# Altium footprint library LDCN Components.PcbLib: 426 footprints (part 25 of 27)
Each footprint in its own frame and in the unit in brackets; x right, y up, seen from the top. Pads: shape width x height; smd on the part's side, far side on the other; paste and mask are expansions set on the pad; w line width, h text height; cw(c..) or ccw(c..) is an arc to the next point about the centre after c.
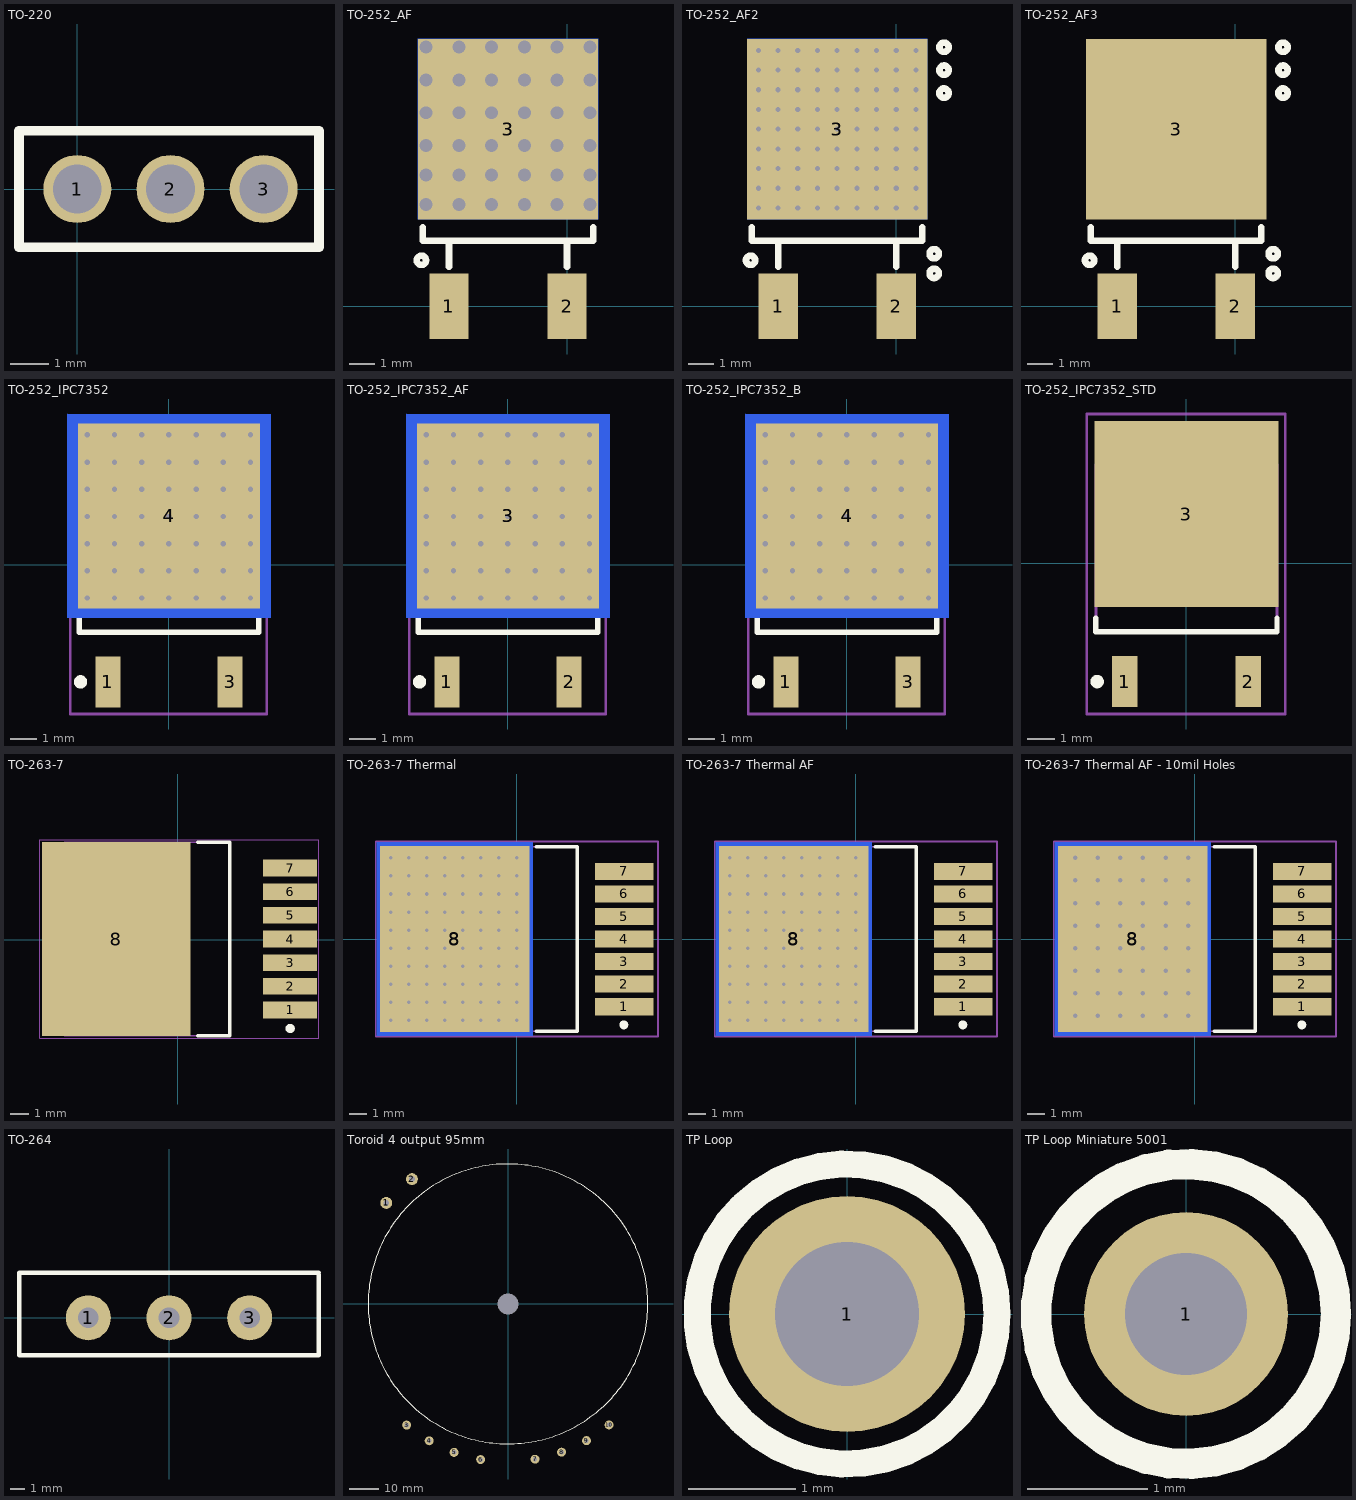
[diagram p24: the footprints below, top view; thin cyan lines are the x and y axes]

## TO-220 [mm] "Positive Voltage Regulator"
pads (3):
  round 1.75 hole 1.25: 1(0,0) 2(2.4,0) 3(4.8,0)
Top Overlay:
  lines w0.254: -1.5,-1.5 -1.5,1.5 6.223,1.5 6.223,-1.5 -1.5,-1.5

## TO-252_AF [mm] "Fairchild DPAK"
height 4
pads (40):
  rect 1.524x2.54 smd: 1(-4.572,0) 2(0,0)
  rect 6.985x6.985 smd: 3(-2.286,6.858)
  rect 6.985x6.985 smd far side: 3(-2.286,6.858)
  round 0.3 hole 0.5: ""(-5.461,3.937) ""(-5.461,5.08) ""(-5.461,6.223) ""(-5.461,7.493) ""(-5.461,8.763) ""(-5.461,10.033) ""(-4.191,3.937) ""(-4.191,5.08) ""(-4.191,6.223) ""(-4.191,7.493) ""(-4.191,8.763) ""(-4.191,10.033) ""(-2.921,3.937) ""(-2.921,5.08) ""(-2.921,6.223) ""(-2.921,7.493) ""(-2.921,8.763) ""(-2.921,10.033) ""(-1.651,3.937) ""(-1.651,5.08) ""(-1.651,6.223) ""(-1.651,7.493) ""(-1.651,8.763) ""(-1.651,10.033) ""(-0.381,3.937) ""(-0.381,5.08) ""(-0.381,6.223) ""(-0.381,7.493) ""(-0.381,8.763) ""(-0.381,10.033) ""(0.889,3.937) ""(0.889,5.08) ""(0.889,6.223) ""(0.889,7.493) ""(0.889,8.763) ""(0.889,10.033)
Top Overlay:
  circle w0.254: c-5.641,1.778 r0.18
  lines w0.254: -5.588,3.048 -5.588,2.54 1.016,2.54 1.016,3.048 ; -4.572,1.524 -4.572,2.54 ; 0,1.524 0,2.54

## TO-252_AF2 [mil] "Fairchild DPAK"
height 157.48
pads (85):
  rect 60x100 smd: 1(-180,0) 2(0,0)
  round 5 hole 7.87: 3(-210,150) 3(-210,180) 3(-210,210) 3(-210,240) 3(-210,270) 3(-210,300) 3(-210,330) 3(-210,360) 3(-210,390) 3(-180,150) 3(-180,180) 3(-180,210) 3(-180,240) 3(-180,270) 3(-180,300) 3(-180,330) 3(-180,360) 3(-180,390) 3(-150,150) 3(-150,180) 3(-150,210) 3(-150,240) 3(-150,270) 3(-150,300) 3(-150,330) 3(-150,360) 3(-150,390) 3(-120,150) 3(-120,180) 3(-120,210) 3(-120,240) 3(-120,270) 3(-120,300) 3(-120,330) 3(-120,360) 3(-120,390) 3(-90,150) 3(-90,180) 3(-90,210) 3(-90,240) 3(-90,270) 3(-90,300) 3(-90,330) 3(-90,360) 3(-90,390) 3(-60,150) 3(-60,180) 3(-60,210) 3(-60,240) 3(-60,270) 3(-60,300) 3(-60,330) 3(-60,360) 3(-60,390) 3(-30,150) 3(-30,180) 3(-30,210) 3(-30,240) 3(-30,270) 3(-30,300) 3(-30,330) 3(-30,360) 3(-30,390) 3(0,150) 3(0,180) 3(0,210) 3(0,240) 3(0,270) 3(0,300) 3(0,330) 3(0,360) 3(0,390) 3(30,150) 3(30,180) 3(30,210) 3(30,240) 3(30,270) 3(30,300) 3(30,330) 3(30,360) 3(30,390)
  rect 275x275 smd: 3(-90,270)
  rect 275x275 smd far side: 3(-90,270)
Top Overlay:
  circle w10: c72.93,325 r7.07
  circle w10: c72.93,360 r7.07
  circle w10: c72.93,395 r7.07
  circle w10: c57.93,50 r7.07
  circle w10: c57.93,80 r7.07
  circle w10: c-222.07,70 r7.07
  lines w10: -220,120 -220,100 40,100 40,120 ; -180,60 -180,100 ; 0,60 0,100

## TO-252_AF3 [mil] "Fairchild DPAK"
height 157.48
pads (3):
  rect 60x100 smd: 1(-180,0) 2(0,0)
  rect 275x275 smd: 3(-90,270)
Top Overlay:
  circle w10: c72.93,325 r7.07
  circle w10: c72.93,360 r7.07
  circle w10: c72.93,395 r7.07
  circle w10: c57.93,50 r7.07
  circle w10: c57.93,80 r7.07
  circle w10: c-222.07,70 r7.07
  lines w10: -220,120 -220,100 40,100 40,120 ; -180,60 -180,100 ; 0,60 0,100

## TO-252_IPC7352 [mm] "IPC7352 DPAK with thermal holes"
height 4
pads (53):
  rect 0.95x1.9 smd: 1(-2.278,-4.383) 3(2.282,-4.383)
  round 0 hole 0.2: 4(-3.05,-1.25) 4(-3.05,-0.234) 4(-3.05,0.782) 4(-3.05,1.798) 4(-3.05,2.814) 4(-3.05,3.83) 4(-3.05,4.846) 4(-2.034,-1.25) 4(-2.034,-0.234) 4(-2.034,0.782) 4(-2.034,1.798) 4(-2.034,2.814) 4(-2.034,3.83) 4(-2.034,4.846) 4(-1.018,-1.25) 4(-1.018,-0.234) 4(-1.018,0.782) 4(-1.018,1.798) 4(-1.018,2.814) 4(-1.018,3.83) 4(-1.018,4.846) 4(-0.002,-1.25) 4(-0.002,-0.234) 4(-0.002,0.782) 4(-0.002,1.798) 4(-0.002,2.814) 4(-0.002,3.83) 4(-0.002,4.846) 4(1.014,-1.25) 4(1.014,-0.234) 4(1.014,0.782) 4(1.014,1.798) 4(1.014,2.814) 4(1.014,3.83) 4(1.014,4.846) 4(2.03,-1.25) 4(2.03,-0.234) 4(2.03,0.782) 4(2.03,1.798) 4(2.03,2.814) 4(2.03,3.83) 4(2.03,4.846) 4(3.046,-1.25) 4(3.046,-0.234) 4(3.046,0.782) 4(3.046,1.798) 4(3.046,2.814) 4(3.046,3.83) 4(3.046,4.846)
  rect 6.8x6.9 smd: 4(0.002,1.817)
  rect 7.62x7.62 smd far side paste-5.08 mask-5.08: 4(0.002,1.817)
Top Overlay:
  circle w0.25: c-3.303,-4.383 r0.125
  lines w0.2: -3.348,-2.033 -3.348,-2.533 3.352,-2.533 3.352,-2.033
Mechanical 13:
  lines w0.1: -3.348,-2.533 -3.348,3.667 3.352,3.667 3.352,-2.533 -3.348,-2.533
Mechanical 15:
  lines w0.1: -3.683,-5.583 -3.683,5.517 ; -3.648,-5.583 3.652,-5.583 3.652,5.517 -3.648,5.517 ; -0.498,-0.033 0.502,-0.033 ; 0.002,-0.533 0.002,0.467

## TO-252_IPC7352_AF [mm] "IPC7352 DPAK with thermal holes and normal pin numbering"
height 4
pads (53):
  rect 0.95x1.9 smd: 1(-2.278,-4.383) 2(2.282,-4.383)
  round 0 hole 0.2: 3(-3.05,-1.25) 3(-3.05,-0.234) 3(-3.05,0.782) 3(-3.05,1.798) 3(-3.05,2.814) 3(-3.05,3.83) 3(-3.05,4.846) 3(-2.034,-1.25) 3(-2.034,-0.234) 3(-2.034,0.782) 3(-2.034,1.798) 3(-2.034,2.814) 3(-2.034,3.83) 3(-2.034,4.846) 3(-1.018,-1.25) 3(-1.018,-0.234) 3(-1.018,0.782) 3(-1.018,1.798) 3(-1.018,2.814) 3(-1.018,3.83) 3(-1.018,4.846) 3(-0.002,-1.25) 3(-0.002,-0.234) 3(-0.002,0.782) 3(-0.002,1.798) 3(-0.002,2.814) 3(-0.002,3.83) 3(-0.002,4.846) 3(1.014,-1.25) 3(1.014,-0.234) 3(1.014,0.782) 3(1.014,1.798) 3(1.014,2.814) 3(1.014,3.83) 3(1.014,4.846) 3(2.03,-1.25) 3(2.03,-0.234) 3(2.03,0.782) 3(2.03,1.798) 3(2.03,2.814) 3(2.03,3.83) 3(2.03,4.846) 3(3.046,-1.25) 3(3.046,-0.234) 3(3.046,0.782) 3(3.046,1.798) 3(3.046,2.814) 3(3.046,3.83) 3(3.046,4.846)
  rect 6.8x6.9 smd: 3(0.002,1.817)
  rect 7.62x7.62 smd far side paste-5.08 mask-5.08: 3(0.002,1.817)
Top Overlay:
  circle w0.25: c-3.303,-4.383 r0.125
  lines w0.2: -3.348,-2.033 -3.348,-2.533 3.352,-2.533 3.352,-2.033
Mechanical 13:
  lines w0.1: -3.348,-2.533 -3.348,3.667 3.352,3.667 3.352,-2.533 -3.348,-2.533
Mechanical 15:
  lines w0.1: -3.683,-5.583 -3.683,5.517 ; -3.648,-5.583 3.652,-5.583 3.652,5.517 -3.648,5.517 ; -0.498,-0.033 0.502,-0.033 ; 0.002,-0.533 0.002,0.467

## TO-252_IPC7352_B [mm] "IPC7352 DPAK with thermal holes and exposed bottom pad"
height 4
pads (53):
  rect 0.95x1.9 smd: 1(-2.278,-4.383) 3(2.282,-4.383)
  round 0 hole 0.2: 4(-3.05,-1.25) 4(-3.05,-0.234) 4(-3.05,0.782) 4(-3.05,1.798) 4(-3.05,2.814) 4(-3.05,3.83) 4(-3.05,4.846) 4(-2.034,-1.25) 4(-2.034,-0.234) 4(-2.034,0.782) 4(-2.034,1.798) 4(-2.034,2.814) 4(-2.034,3.83) 4(-2.034,4.846) 4(-1.018,-1.25) 4(-1.018,-0.234) 4(-1.018,0.782) 4(-1.018,1.798) 4(-1.018,2.814) 4(-1.018,3.83) 4(-1.018,4.846) 4(-0.002,-1.25) 4(-0.002,-0.234) 4(-0.002,0.782) 4(-0.002,1.798) 4(-0.002,2.814) 4(-0.002,3.83) 4(-0.002,4.846) 4(1.014,-1.25) 4(1.014,-0.234) 4(1.014,0.782) 4(1.014,1.798) 4(1.014,2.814) 4(1.014,3.83) 4(1.014,4.846) 4(2.03,-1.25) 4(2.03,-0.234) 4(2.03,0.782) 4(2.03,1.798) 4(2.03,2.814) 4(2.03,3.83) 4(2.03,4.846) 4(3.046,-1.25) 4(3.046,-0.234) 4(3.046,0.782) 4(3.046,1.798) 4(3.046,2.814) 4(3.046,3.83) 4(3.046,4.846)
  rect 6.8x6.9 smd: 4(0.002,1.817)
  rect 7.62x7.62 smd far side: 4(0.002,1.817)
Top Overlay:
  circle w0.25: c-3.303,-4.383 r0.125
  lines w0.2: -3.348,-2.033 -3.348,-2.533 3.352,-2.533 3.352,-2.033
Mechanical 13:
  lines w0.1: -3.348,-2.533 -3.348,3.667 3.352,3.667 3.352,-2.533 -3.348,-2.533
Mechanical 15:
  lines w0.1: -3.683,-5.583 -3.683,5.517 ; -3.648,-5.583 3.652,-5.583 3.652,5.517 -3.648,5.517 ; -0.498,-0.033 0.502,-0.033 ; 0.002,-0.533 0.002,0.467

## TO-252_IPC7352_STD [mm] "IPC7352 DPAK with normal pin numbering"
height 4
pads (3):
  rect 0.95x1.9 smd: 1(-2.278,-4.383) 2(2.282,-4.383)
  rect 6.8x6.9 smd: 3(0.002,1.817)
Top Overlay:
  circle w0.25: c-3.303,-4.383 r0.125
  lines w0.2: -3.348,-2.033 -3.348,-2.533 3.352,-2.533 3.352,-2.033
Mechanical 13:
  lines w0.1: -3.348,-2.533 3.352,-2.533 3.352,3.667 -3.348,3.667 -3.348,-2.533
Mechanical 15:
  lines w0.1: -3.683,-5.583 -3.683,5.517 ; -3.648,-5.583 3.652,-5.583 3.652,5.517 -3.648,5.517 ; -0.498,-0.033 0.502,-0.033 ; 0.002,-0.533 0.002,0.467

## TO-263-7 [mm] "IPC7352 DPAK with 7 Leads"
height 4
pads (8):
  rect 2.9x0.9 smd: 1(6.031,-3.782) 2(6.031,-2.512) 3(6.031,-1.242) 4(6.031,0.028) 5(6.031,1.298) 6(6.031,2.568) 7(6.031,3.838)
  rect 8x10.45 smd: 8(-3.319,0.028)
Top Overlay:
  circle w0.25: c6.031,-4.782 r0.125
  lines w0.2: 1.081,-5.172 2.781,-5.172 2.781,5.228 1.081,5.228
Mechanical 13:
  lines w0.1: -6.109,-5.172 -6.109,5.228 2.781,5.228 2.781,-5.172 -6.109,-5.172
Mechanical 15:
  lines w0.05: -7.419,-5.297 -7.419,5.353 7.581,5.353 7.581,-5.297 -7.419,-5.297
  lines w0.1: -0.419,0.028 0.581,0.028 ; 0.081,-0.472 0.081,0.528
3D body: height 4.64, standoff 0, extent -6.109,-5.172 2.781,5.228

## TO-263-7 Thermal [mil] "IPC7352 DPAK with 7 Leads, thermal holes and exposed bottom pad"
height 157.48
pads (89):
  rect 129.92x38 smd: 1(238.31,-150) 2(238.31,-100) 3(238.31,-50) 4(238.31,0) 5(238.31,50) 6(238.31,100) 7(238.31,150)
  round 0 hole 7.87: 8(-280,-180) 8(-280,-140) 8(-280,-100) 8(-280,-60) 8(-280,-20) 8(-280,20) 8(-280,60) 8(-280,100) 8(-280,140) 8(-280,180) 8(-240,-180) 8(-240,-140) 8(-240,-100) 8(-240,-60) 8(-240,-20) 8(-240,20) 8(-240,60) 8(-240,100) 8(-240,140) 8(-240,180) 8(-200,-180) 8(-200,-140) 8(-200,-100) 8(-200,-60) 8(-200,-20) 8(-200,20) 8(-200,60) 8(-200,100) 8(-200,140) 8(-200,180) 8(-160,-180) 8(-160,-140) 8(-160,-100) 8(-160,-60) 8(-160,-20) 8(-160,20) 8(-160,60) 8(-160,100) 8(-160,140) 8(-160,180) 8(-120,-180) 8(-120,-140) 8(-120,-100) 8(-120,-60) 8(-120,-20) 8(-120,20) 8(-120,60) 8(-120,100) 8(-120,140) 8(-120,180) 8(-80,-180) 8(-80,-140) 8(-80,-100) 8(-80,-60) 8(-80,-20) 8(-80,20) 8(-80,60) 8(-80,100) 8(-80,140) 8(-80,180) 8(-40,-180) 8(-40,-140) 8(-40,-100) 8(-40,-60) 8(-40,-20) 8(-40,20) 8(-40,60) 8(-40,100) 8(-40,140) 8(-40,180) 8(0,-180) 8(0,-140) 8(0,-100) 8(0,-60) 8(0,-20) 8(0,20) 8(0,60) 8(0,100) 8(0,140) 8(0,180)
  rect 330.71x413.39 smd: 8(-137.68,0.2)
  rect 346.46x429.13 smd far side: 8(-137.68,0.2)
Top Overlay:
  circle w9.84: c237.32,-190.35 r4.92
  lines w7.87: 43.43,-204.53 133.98,-204.53 133.98,204.92 43.43,204.92
Mechanical 13:
  lines w3.94: -236.1,-204.53 -236.1,204.92 133.98,204.92 133.98,-204.53 -236.1,-204.53
Mechanical 15:
  lines w3.94: -19.57,0.2 19.8,0.2 ; 0.12,-19.49 0.12,19.88 ; -312.87,-216.34 -312.87,216.73 313.11,216.73 313.11,-216.34 -312.87,-216.34
3D body: height 183.07, standoff 0, extent -236.1,-204.53 133.98,204.92

## TO-263-7 Thermal AF [mil] "IPC7352 DPAK with 7 Leads and thermal holes"
height 157.48
pads (89):
  rect 129.92x38 smd: 1(238.31,-150) 2(238.31,-100) 3(238.31,-50) 4(238.31,0) 5(238.31,50) 6(238.31,100) 7(238.31,150)
  round 0 hole 7.87: 8(-280,-180) 8(-280,-140) 8(-280,-100) 8(-280,-60) 8(-280,-20) 8(-280,20) 8(-280,60) 8(-280,100) 8(-280,140) 8(-280,180) 8(-240,-180) 8(-240,-140) 8(-240,-100) 8(-240,-60) 8(-240,-20) 8(-240,20) 8(-240,60) 8(-240,100) 8(-240,140) 8(-240,180) 8(-200,-180) 8(-200,-140) 8(-200,-100) 8(-200,-60) 8(-200,-20) 8(-200,20) 8(-200,60) 8(-200,100) 8(-200,140) 8(-200,180) 8(-160,-180) 8(-160,-140) 8(-160,-100) 8(-160,-60) 8(-160,-20) 8(-160,20) 8(-160,60) 8(-160,100) 8(-160,140) 8(-160,180) 8(-120,-180) 8(-120,-140) 8(-120,-100) 8(-120,-60) 8(-120,-20) 8(-120,20) 8(-120,60) 8(-120,100) 8(-120,140) 8(-120,180) 8(-80,-180) 8(-80,-140) 8(-80,-100) 8(-80,-60) 8(-80,-20) 8(-80,20) 8(-80,60) 8(-80,100) 8(-80,140) 8(-80,180) 8(-40,-180) 8(-40,-140) 8(-40,-100) 8(-40,-60) 8(-40,-20) 8(-40,20) 8(-40,60) 8(-40,100) 8(-40,140) 8(-40,180) 8(0,-180) 8(0,-140) 8(0,-100) 8(0,-60) 8(0,-20) 8(0,20) 8(0,60) 8(0,100) 8(0,140) 8(0,180)
  rect 330.71x413.39 smd: 8(-137.68,0.2)
  rect 346.46x429.13 smd far side paste-200 mask-200: 8(-137.68,0.2)
Top Overlay:
  circle w9.84: c237.32,-190.35 r4.92
  lines w7.87: 43.43,-204.53 133.98,-204.53 133.98,204.92 43.43,204.92
Mechanical 13:
  lines w3.94: -236.1,-204.53 -236.1,204.92 133.98,204.92 133.98,-204.53 -236.1,-204.53
Mechanical 15:
  lines w3.94: -19.57,0.2 19.8,0.2 ; 0.12,-19.49 0.12,19.88 ; -312.87,-216.34 -312.87,216.73 313.11,216.73 313.11,-216.34 -312.87,-216.34
3D body: height 183.07, standoff 0, extent -236.1,-204.53 133.98,204.92

## TO-263-7 Thermal AF - 10mil Holes [mil] "IPC7352 DPAK with 7 Leads and 10 Mil thermal holes"
height 157.48
pads (57):
  rect 129.92x38 smd: 1(238.31,-150) 2(238.31,-100) 3(238.31,-50) 4(238.31,0) 5(238.31,50) 6(238.31,100) 7(238.31,150)
  round 0 hole 10: 8(-265,-170) 8(-265,-120) 8(-265,-70) 8(-265,-20) 8(-265,30) 8(-265,80) 8(-265,130) 8(-265,180) 8(-215,-170) 8(-215,-120) 8(-215,-70) 8(-215,-20) 8(-215,30) 8(-215,80) 8(-215,130) 8(-215,180) 8(-165,-170) 8(-165,-120) 8(-165,-70) 8(-165,-20) 8(-165,30) 8(-165,80) 8(-165,130) 8(-165,180) 8(-115,-170) 8(-115,-120) 8(-115,-70) 8(-115,-20) 8(-115,30) 8(-115,80) 8(-115,130) 8(-115,180) 8(-65,-170) 8(-65,-120) 8(-65,-70) 8(-65,-20) 8(-65,30) 8(-65,80) 8(-65,130) 8(-65,180) 8(-15,-170) 8(-15,-120) 8(-15,-70) 8(-15,-20) 8(-15,30) 8(-15,80) 8(-15,130) 8(-15,180)
  rect 330.71x413.39 smd: 8(-137.68,0.2)
  rect 346.46x429.13 smd far side paste-200 mask-200: 8(-137.68,0.2)
Top Overlay:
  circle w9.84: c237.32,-190.35 r4.92
  lines w7.87: 43.43,-204.53 133.98,-204.53 133.98,204.92 43.43,204.92
Mechanical 13:
  lines w3.94: -236.1,-204.53 -236.1,204.92 133.98,204.92 133.98,-204.53 -236.1,-204.53
Mechanical 15:
  lines w3.94: -19.57,0.2 19.8,0.2 ; 0.12,-19.49 0.12,19.88 ; -312.87,-216.34 -312.87,216.73 313.11,216.73 313.11,-216.34 -312.87,-216.34
3D body: height 183.07, standoff 0, extent -236.1,-204.53 133.98,204.92

## TO-264 [mil]
pads (3):
  round 120 hole 55: 1(-215,0) 2(0,0) 3(215,0)
Top Overlay:
  lines w12: 400,115 400,-100 -400,-100 -400,120 0,120 400,120

## Toroid 4 output 95mm [mm]
height 65
pads (11):
  round 1.524 hole 7: 0(0,0)
  round 4 hole 2: 1(-40.894,33.909) 2(-32.258,41.91)
  round 3 hole 1.5: 3(-34.041,-40.696) 4(-26.479,-45.991) 5(-18.113,-49.892) 6(-9.196,-52.281) 7(9.071,-52.176) 8(17.994,-49.809) 9(26.37,-45.927) 10(33.944,-40.651)
Top Overlay:
  circle w0.254: c0,0 r47

## TP Loop [mm] "Test Point Loop"
height 7
pads (1):
  round 2.2 hole 1.34: 1(0,0)
Top Overlay:
  circle w0.254: c0,0 r1.4

## TP Loop Miniature 5001 [mm] "Test Point Loop"
height 4.57
pads (1):
  round 1.7 hole 1.02: 1(0,0)
Top Overlay:
  circle w0.254: c0,0 r1.25